# Altium footprint library LFI Power Board PcbLib1.PcbLib: 43 footprints (part 2 of 3)
Each footprint in its own frame and in the unit in brackets; x right, y up, seen from the top. Pads: shape width x height; smd on the part's side, far side on the other; paste and mask are expansions set on the pad; w line width, h text height; cw(c..) or ccw(c..) is an arc to the next point about the centre after c.
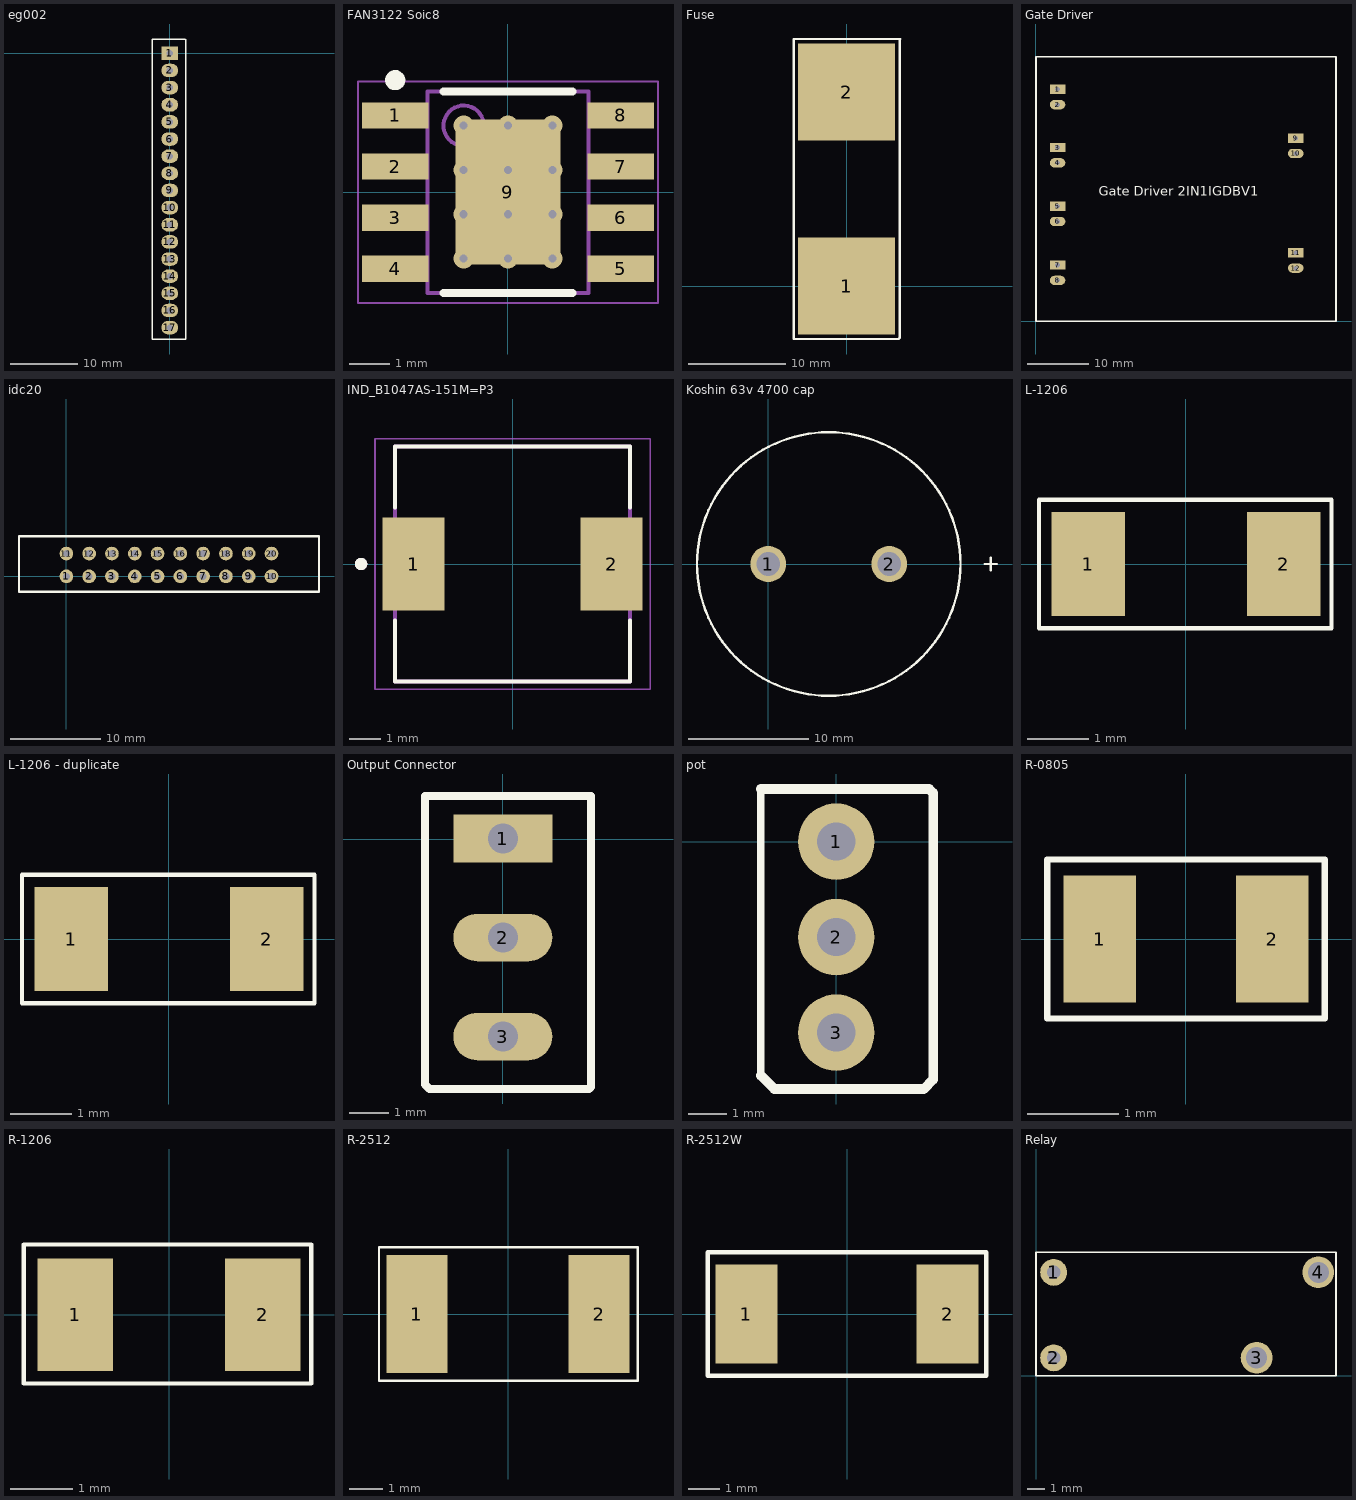
[diagram p1: the footprints below, top view; thin cyan lines are the x and y axes]

## eg002 [mm]
pads (17):
  rect 2.5x2 hole 1: 1(0,0)
  oval 2.5x2 hole 1: 2(0,-2.54) 3(0,-5.08) 4(0,-7.62) 5(0,-10.16) 6(0,-12.7) 7(0,-15.24) 8(0,-17.78) 9(0,-20.32) 10(0,-22.86) 11(0,-25.4) 12(0,-27.94) 13(0,-30.48) 14(0,-33.02) 15(0,-35.56) 16(0,-38.1) 17(0,-40.64)
Top Overlay:
  lines w0.2: 2.315,2.12 -2.565,2.12 -2.565,-42.325 2.35,-42.325 2.35,2.12
3D body "SPWM Controller.step": height 34.09, standoff -6.79, extent -4.975,-41.283 1.315,5.583

## FAN3122 Soic8 [mm] "SOIC, 8-Leads, Body 4.95x3.95mm, Pitch 1.27mm, Thermal Pad 4.10x3.10mm, IPC Medium Density"
height 1.75
pads (9):
  rect 1.65x0.65 smd: 1(-2.8,1.905) 2(-2.8,0.635) 3(-2.8,-0.635) 4(-2.8,-1.905) 5(2.8,-1.905) 6(2.8,-0.635) 7(2.8,0.635) 8(2.8,1.905)
  rect 2.6x3.6 smd: 9(0,0)
via -1.1,1.65 diameter 0.5 hole 0.2
via 0,1.65 diameter 0.5 hole 0.2
via 1.1,1.65 diameter 0.5 hole 0.2
via -1.1,0.55 diameter 0.5 hole 0.2
via 0,0.55 diameter 0.5 hole 0.2
via 1.1,0.55 diameter 0.5 hole 0.2
via -1.1,-0.55 diameter 0.5 hole 0.2
via 0,-0.55 diameter 0.5 hole 0.2
via 1.1,-0.55 diameter 0.5 hole 0.2
via -1.1,-1.65 diameter 0.5 hole 0.2
via 0,-1.65 diameter 0.5 hole 0.2
via 1.1,-1.65 diameter 0.5 hole 0.2
Top Overlay:
  circle w0.25: c-2.8,2.78 r0.125
  lines w0.2: -1.6,-2.5 1.6,-2.5 ; -1.6,2.5 1.6,2.5
Assembly Top:
  circle w0.1: c-1.1,1.65 r0.5
  lines w0.1: -2,-2.5 -2,2.5 2,2.5 2,-2.5 -2,-2.5
Courtyard Top:
  lines w0.05: -3.725,-2.75 -3.725,2.75 3.725,2.75 3.725,-2.75 -3.725,-2.75
  lines w0.1: -0.5,0 0.5,0 ; 0,-0.5 0,0.5
3D body "User Library-SOIC8_JEDEC_MS-012AA.STEP": height 1.66, standoff -0.09, extent -3.124,-2.55 3.075,2.45

## Fuse [mm]
pads (2):
  rect 10x10 smd: 1(0,0) 2(0,20)
Top Overlay:
  lines w0.254: -5.425,-5.425 -5.425,25.475 5.525,25.475 5.475,25.425 5.475,-5.325 5.35,-5.45 -5.4,-5.45 -5.425,-5.425

## Gate Driver [mm]
pads (12):
  rect 2.524x1.524 hole 0.762 square: 1(3.525,37.9) 3(3.525,28.4) 5(3.525,18.825) 7(3.525,9.2) 9(42.425,29.925) 11(42.425,11.2)
  oval 2.524x1.524 hole 0.762 square: 2(3.525,35.4) 4(3.525,25.9) 6(3.525,16.325) 8(3.525,6.7) 10(42.425,27.425) 12(42.425,8.7)
Top Overlay:
  lines w0.254: 0,0 49,0 49,43.25 0,43.25 0,0
  text "Gate Driver 2IN1IGDBV1" at 10.25,20.5 h1.52
3D body "Gate Driver Board.step": height 14.34, standoff -5.89, extent 0,0 49.1,43.25

## idc20 [mil]
pads (20):
  round 60 hole 30: 1(0,0) 2(100,0) 3(200,0) 4(300,0) 5(400,0) 6(500,0) 7(600,0) 8(700,0) 9(800,0) 10(900,0) 11(0,100) 12(100,100) 13(200,100) 14(300,100) 15(400,100) 16(500,100) 17(600,100) 18(700,100) 19(800,100) 20(900,100)
Top Overlay:
  lines w10: -207.8,-67.76 -169.57,-67.76 1108.36,-67.76 1108.36,176.18 -207.8,176.18 -207.8,-29.53 -207.8,-67.76
3D body "20-Pin Shrouded Header (IDC) Straight.stp": height 350.5, standoff -167.85, extent -125,-138.78 1025,230.16

## IND_B1047AS-151M=P3 [mm]
pads (2):
  rect 2x3 smd: 1(-3.2,0) 2(3.2,0)
Top Overlay:
  circle w0.2: c-4.9,0 r0.1
  lines w0.127: -3.8,-1.82 -3.8,-3.8 3.8,-3.8 3.8,-1.82 ; -3.8,1.82 -3.8,3.8 3.8,3.8 3.8,1.82
Mechanical 13:
  circle w0.2: c-4.9,0 r0.1
  lines w0.127: -3.8,-3.8 -3.8,3.8 3.8,3.8 3.8,-3.8 -3.8,-3.8
Mechanical 15:
  lines w0.05: -4.45,-4.05 -4.45,4.05 4.45,4.05 4.45,-4.05 -4.45,-4.05
3D body "B1047AS-221M=P3--3DModel-STEP-46669.STEP": height 5.01, standoff 0.01, extent -3.8,-3.8 3.8,3.8

## Koshin 63v 4700 cap [mm]
pads (2):
  round 3 hole 2: 1(0,0) 2(10.1,0)
Top Overlay:
  circle w0.2: c5.05,0 r11
  lines w0.2: 18.082,0 19.098,0 ; 18.59,-0.508 18.59,0.508
3D body "U1-YY.step": height 49.77, standoff -5.58, extent -6.045,-11.176 15.951,10.82

## L-1206 [mm]
pads (2):
  rect 1.2x1.7 smd: 1(-1.6,0) 2(1.6,0)
Top Overlay:
  lines w0.07: -2.4,-1.05 -2.4,1.05 2.375,1.05 2.375,0.692 2.375,0.556 2.375,-0.531 2.375,-1.05 -2.4,-1.05
3D body "SML-LXLC1206.stp": height 1.11, standoff 0, extent -1.73,-0.8 1.476,0.8

## L-1206 - duplicate [mm]
pads (2):
  rect 1.2x1.7 smd: 1(-1.6,0) 2(1.6,0)
Top Overlay:
  lines w0.07: -2.4,-1.05 -2.4,1.05 2.375,1.05 2.375,0.692 2.375,0.556 2.375,-0.531 2.375,-1.05 -2.4,-1.05
3D body "SML-LXLC1206.stp": height 1.11, standoff 0, extent -1.73,-0.8 1.476,0.8

## Output Connector [mm]
pads (3):
  rect 2.5x1.2 hole 0.762 square: 1(0,0.025)
  oval 2.5x1.2 hole 0.762 square: 2(0,-2.475) 3(0,-4.975)
Top Overlay:
  lines w0.2: -1.965,-6.185 -1.965,1.1 2.225,1.1 2.225,-6.25 2.175,-6.3 0.45,-6.3 -1.85,-6.3 -1.965,-6.185

## pot [mm]
pads (3):
  round 2 hole 1: 1(0,0) 2(0,-2.5) 3(0,-5)
Top Overlay:
  lines w0.2: -1.975,-6.123 -1.975,1.377 ; 2.54,-6.23 2.54,1.27
  lines w0.254: -1.975,-6.123 -1.621,-6.477 2.293,-6.477 2.54,-6.23 2.54,1.27 2.433,1.377 -1.975,1.377
3D body "Trimmer 3296.SLDPRT": height 11.36, standoff -2.99, extent -2.079,-7.34 2.921,2.26

## R-0805 [mm]
pads (2):
  rect 0.8x1.4 smd: 1(-0.95,0) 2(0.95,0)
Top Overlay:
  lines w0.07: -1.525,-0.875 -1.525,0.875 1.525,0.875 1.525,-0.875 -1.525,-0.875
3D body "User Library-CR2012-0805.STEP": height 0.56, standoff -0.04, extent -1,-0.625 1,0.625

## R-1206 [mm]
pads (2):
  rect 1.2x1.8 smd: 1(-1.5,0) 2(1.5,0)
Top Overlay:
  lines w0.07: -0.275,-1.1 2.275,-1.1 ; -0.275,-1.1 -2.325,-1.1 -2.325,0.625 -2.325,1.125 -1.175,1.125 1.125,1.125 2.275,1.125 2.275,-1.1 ; -0.275,-1.1 2.275,-1.1
3D body "User Library-CR3216-1206.step": height 0.56, standoff -0.04, extent -1.6,-0.775 1.6,0.825

## R-2512 [mm]
pads (2):
  rect 1.8x3.5 smd: 1(-2.7,0) 2(2.7,0)
Top Overlay:
  lines w0.07: -3.825,-1.975 3.85,-1.975 3.85,1.975 -3.825,1.975 -3.825,0.525 -3.825,-1.975
3D body "User Library-R SMD 2512.STEP": height 0.59, standoff -0.01, extent -3.206,-1.575 3.094,1.575

## R-2512W [mm] "resistor 2512 wave soldering"
pads (2):
  rect 2x3.2 smd: 1(-3.25,0) 2(3.25,0)
Top Overlay:
  lines w0.152: -4.5,-2 2.15,-2 4.5,-2 4.5,2 2.15,2 -4.5,2 -4.5,-2
3D body "res2512.stp": height 0.55, standoff 0, extent -3.15,-1.55 3.15,1.55

## Relay [mm]
pads (4):
  round 1.524 hole 0.762: 1(1,5.86) 2(1,1.016)
  round 1.8 hole 1.2: 3(12.5,1.016) 4(16,5.86)
Top Overlay:
  lines w0.1: 0,0 0,7 17,7 17,0 0,0